# Altium footprint library MyPcbLib.PcbLib: 87 footprints (part 5 of 6)
Each footprint in its own frame and in the unit in brackets; x right, y up, seen from the top. Pads: shape width x height; smd on the part's side, far side on the other; paste and mask are expansions set on the pad; w line width, h text height; cw(c..) or ccw(c..) is an arc to the next point about the centre after c.
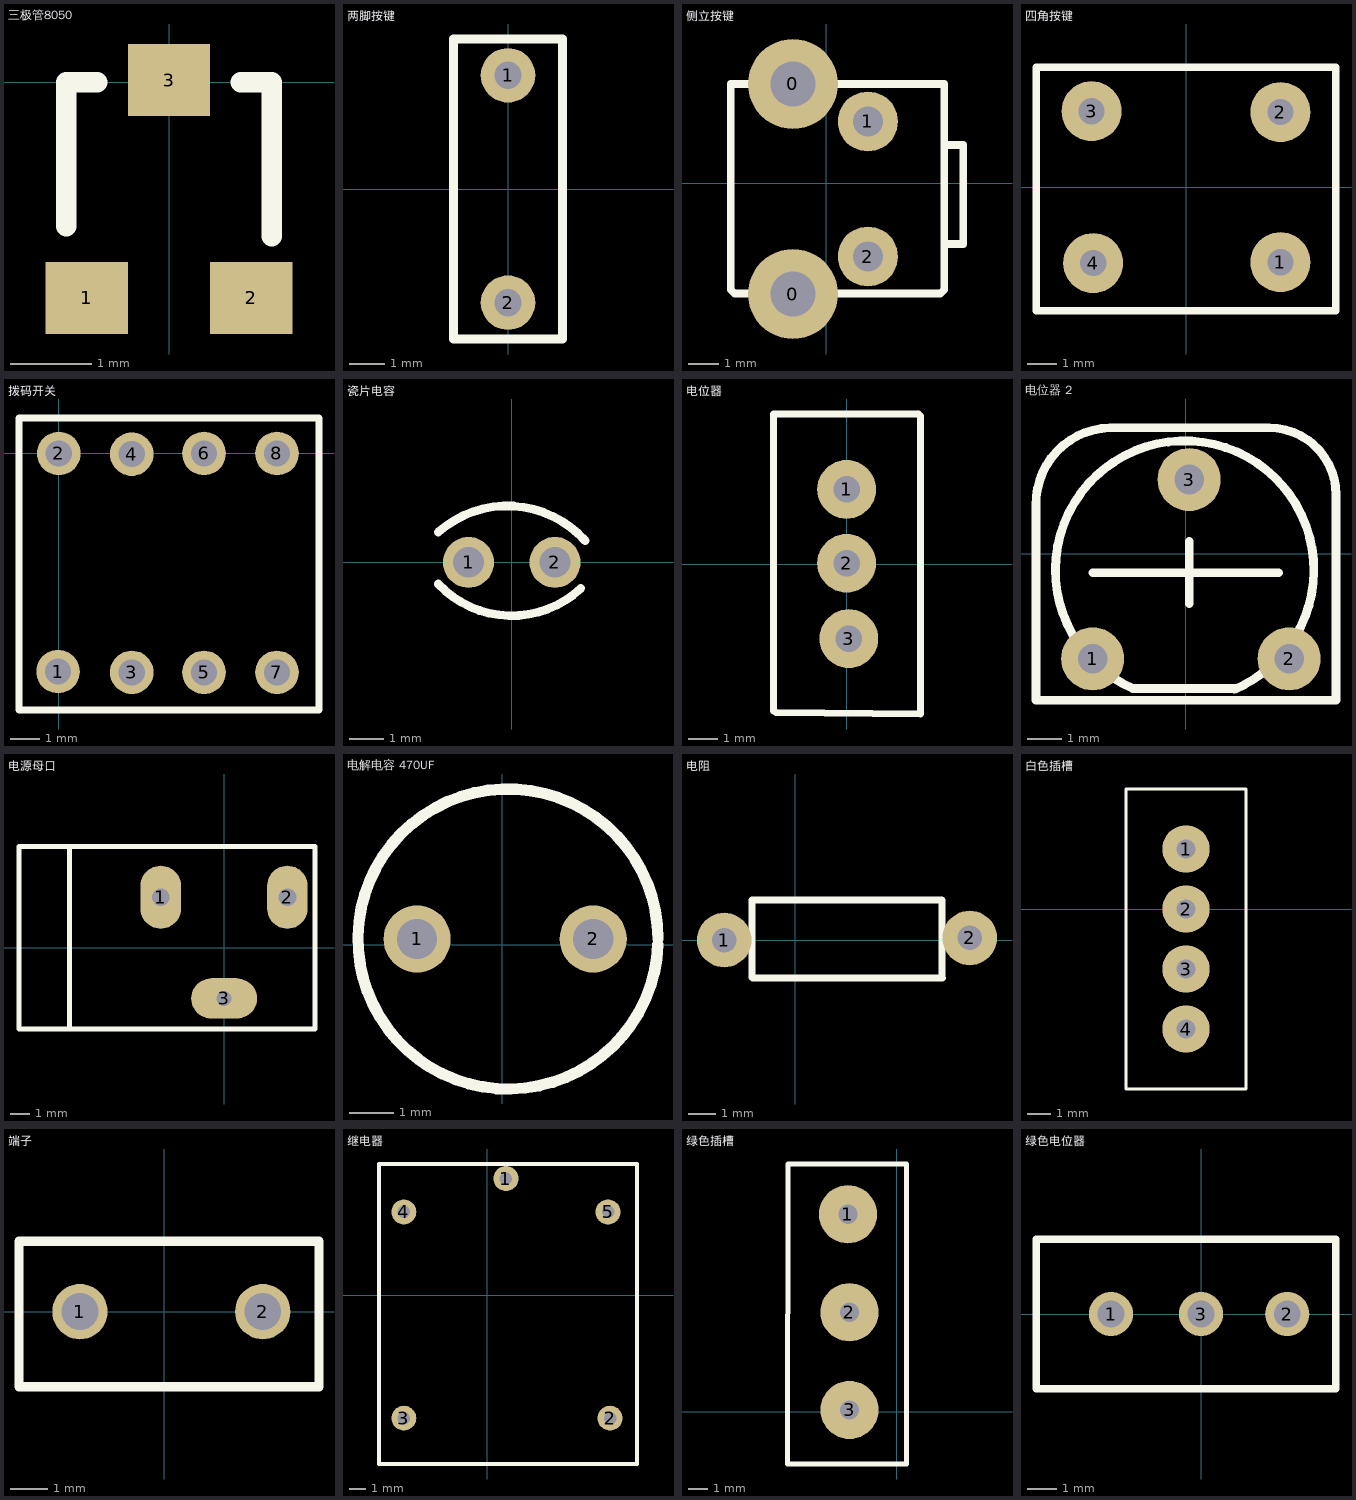
[diagram p4: the footprints below, top view; thin cyan lines are the x and y axes]

## 三极管8050 [mil]
pads (3):
  rect 40x35 smd: 1(-40,-105) 2(40,-105) 3(0,1)
Top Overlay:
  lines w10: -50,-70 -50,0 -35,0 ; 35,0 50,0 50,-75

## 两脚按键 [mil]
pads (2):
  round 60 hole 30: 1(0,125) 2(0,-125)
Top Overlay:
  lines w10: -60,-165 60,-165 60,165 -60,165 -60,-165

## 侧立按键 [mm]
pads (4):
  round 3 hole 1.5: 0(-1.103,-3.698) 0(-1.103,3.302)
  round 2 hole 1: 1(1.397,2.052) 2(1.397,-2.448)
Top Overlay:
  lines w0.254: 3.937,-2.032 4.572,-2.032 4.572,1.27 3.937,1.27 ; -3.175,-3.556 -3.175,3.302 3.937,3.302 3.937,-3.556 3.81,-3.683 -3.048,-3.683 -3.175,-3.556
Bottom Overlay:
  lines w0.254: -1.103,-3.698 -1.103,-3.683

## 四角按键 [mil]
pads (4):
  round 80 hole 35 unplated: 1(125.92,-100.14) 2(125.92,100.14) 3(-125.92,101.28) 4(-123.76,-101.28)
Top Overlay:
  lines w10: -200,-165 -200,160 200,160 200,-165 -200,-165

## 拨码开关 [mm]
pads (8):
  round 1.5 hole 0.9: 1(-0.025,-7.518) 2(0,0) 3(2.515,-7.544) 4(2.515,-0.025) 5(5.004,-7.544) 6(5.004,0) 7(7.518,-7.544) 8(7.518,0)
Top Overlay:
  lines w0.254: -1.372,-8.839 -1.372,1.219 8.966,1.219 8.966,-8.839 -1.372,-8.839

## 瓷片电容 [mm]
pads (2):
  round 1.5 hole 0.9: 1(-1.27,0) 2(1.27,0)
Top Overlay:
  lines w0.254: -2.159,-0.635 ccw(c0,1.397) 2.032,-0.762 ; -2.159,0.889 cw(c-0.127,-1.397) 2.159,0.635

## 电位器 [mm]
pads (3):
  round 2 hole 0.9: 1(0,2.54) 2(0,0.025) 3(0.076,-2.54)
Top Layer:
  lines w0.254: 2.438,5.105 2.515,5.029
Top Overlay:
  lines w0.254: -2.489,-5.004 -2.489,5.105 2.438,5.105 ; -2.388,-5.055 2.515,-5.105 2.515,5.029

## 电位器 2 [mil]
pads (3):
  round 72 hole 34: 1(-106.26,-119.96) 2(118.15,-119.96) 3(3.98,84.76)
Top Overlay:
  lines w10: -170.92,-167.2 133.9,-167.2 171.62,-167.2 171.62,67.38 ccw(c95.36,67.57) 95.36,143.82 -86.57,143.82 ccw(c-84.47,57.36) -170.92,55.26 -170.92,-165.54 ; -106.26,-21.54 106.34,-21.54 ; 3.98,-56.97 3.98,13.9 ; 55.16,-153.95 -60.1,-153.95 cw(c-1.25,-18.62) 55.53,-154.83

## 电源母口 [mil]
pads (3):
  oval 80x125 hole 35.33: 1(-125,100) 2(125,100)
  oval 130x80 hole 30: 3(0,-100)
Top Overlay:
  lines w10: -305,-160 -305,200 ; -405,-160 180,-160 180,200 -405,200 -405,-160

## 电解电容 470UF [mm]
pads (2):
  round 1.5 hole 0.9: 1(-1.905,0.127) 2(2.032,0.127)
Top Overlay:
  lines w0.254: 3.478,0.003 cw(c0.127,0.127) 3.48,0.127

## 电阻 [mm]
pads (2):
  round 2 hole 0.9: 1(-2.591,0) 2(6.401,0.076)
Top Overlay:
  lines w0.254: -1.575,-1.372 -1.575,0 -1.575,1.473 5.385,1.473 5.385,-1.372 ; -1.549,-1.397 5.41,-1.397
Multi-Layer:
  lines w0.254: -1.575,-1.372 -1.549,-1.397

## 白色插槽 [mm]
pads (4):
  round 2 hole 0.8: 1(7.62,2.54) 2(7.62,0) 3(7.62,-2.54) 4(7.62,-5.08)
Top Overlay:
  lines w0.127: 5.08,-7.62 10.16,-7.62 10.16,5.08 5.08,5.08 5.08,-7.62

## 端子 [mm]
pads (2):
  round 1.5 hole 1: 1(-2.286,0) 2(2.667,0)
Top Overlay:
  lines w0.254: -3.937,-2.032 4.191,-2.032 4.191,1.905 -3.937,1.905 -3.937,-2.032

## 继电器 [mil]
pads (5):
  round 60 hole 30: 1(45,280) 2(295,-295) 3(-200,-295) 4(-200,200) 5(290,200)
Top Overlay:
  lines w10: -260,-405 360,-405 360,315 -260,315 -260,-405

## 绿色插槽 [mm]
pads (3):
  round 3 hole 1: 1(-2.515,10.185) 2(-2.438,5.131) 3(-2.436,0.094)
Top Overlay:
  lines w0.254: -5.613,12.776 -5.639,-2.692 0.508,-2.692 0.508,12.776 -5.512,12.776

## 绿色电位器 [mm]
pads (3):
  round 1.5 hole 0.9: 1(-3.048,0) 2(2.921,0) 3(0,0)
Top Overlay:
  lines w0.254: -5.588,-2.54 4.572,-2.54 4.572,2.54 -5.588,2.54 -5.588,-2.54